# Altium footprint library Footprint.PcbLib: 137 footprints (part 2 of 9)
Each footprint in its own frame and in the unit in brackets; x right, y up, seen from the top. Pads: shape width x height; smd on the part's side, far side on the other; paste and mask are expansions set on the pad; w line width, h text height; cw(c..) or ccw(c..) is an arc to the next point about the centre after c.
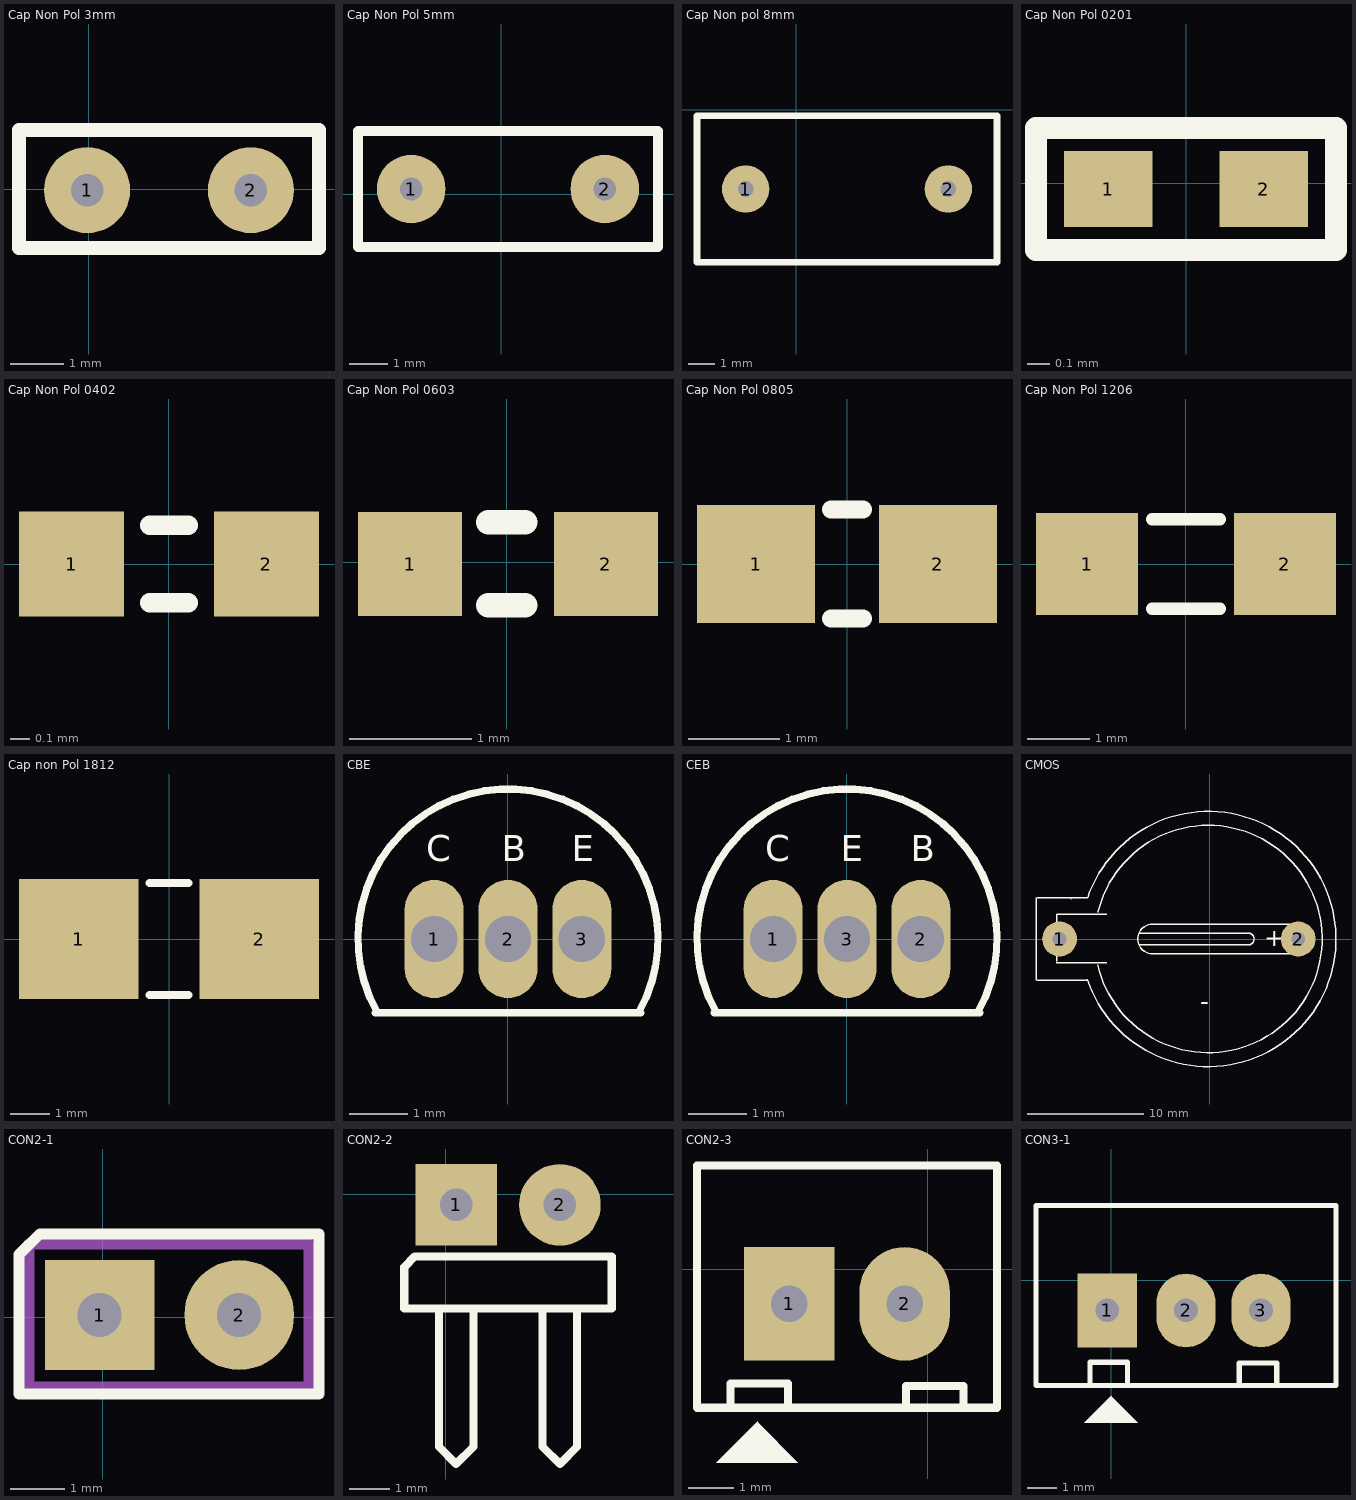
[diagram p1: the footprints below, top view; thin cyan lines are the x and y axes]

## Cap Non Pol 3mm [mm] "d=3mm, pitch=0.1in"
pads (2):
  round 1.6 hole 0.6: 1(-0.026,-0.022) 2(3.022,-0.022)
Top Overlay:
  lines w0.254: -1.296,-1.1 4.292,-1.1 4.292,1.1 -1.296,1.1 -1.296,-1.1
3D body "User Library-Cap 100n.step": height 6.22, standoff -1.7, extent -1.421,-0.855 4.417,0.842

## Cap Non Pol 5mm [mm] "d=5mm, pitch= 0.2in"
pads (2):
  round 1.8 hole 0.6: 1(-2.358,0.132) 2(2.722,0.132)
Top Overlay:
  lines w0.254: -3.755,-1.392 -3.755,1.656 4.119,1.656 4.119,-1.392 -3.755,-1.392
3D body "WIMA RM5 7.2x3x7.5.step": height 7.53, standoff -2.47, extent -3.418,-1.367 3.782,1.633

## Cap Non pol 8mm [mm] "d=8mm,pitch=0.3in"
pads (2):
  round 1.8 hole 0.6: 1(-1.935,-3.016) 2(5.787,-3.016)
Top Overlay:
  lines w0.254: -3.789,-5.81 -3.789,-0.222 7.641,-0.222 7.641,-5.81 -3.789,-5.81
3D body "WIMA RM7.5 10.3x5x12.5.step": height 12.5, standoff -2.5, extent -3.224,-5.518 7.076,-0.518

## Cap Non Pol 0201 [mm] "Cap Non Pol 0201"
pads (2):
  rect 0.4x0.34 smd: 1(-0.35,-0.025) 2(0.35,-0.025)
Top Overlay:
  lines w0.1: -0.675,-0.3 -0.675,0.25 0.675,0.25 0.675,-0.3 -0.675,-0.3
3D body "Cap Non Pol 0201.step": height 0.2, standoff 0, extent -0.3,-0.175 0.3,0.125

## Cap Non Pol 0402 [mm] "Cap Non Pol 0402"
height 0.3
pads (2):
  rect 0.54x0.54 smd: 1(-0.5,0) 2(0.5,0)
Top Overlay:
  lines w0.1: -0.1,-0.2 0.1,-0.2 ; -0.1,0.2 0.1,0.2
3D body "Cap Non Pol 0402.step": height 0.3, standoff 0, extent -0.5,-0.25 0.5,0.25

## Cap Non Pol 0603 [mm] "Cap Non Pol 0603"
pads (2):
  rect 0.85x0.85 smd: 1(-0.79,-0.015) 2(0.81,-0.015)
Top Overlay:
  lines w0.2: -0.15,-0.35 0.15,-0.35 ; -0.15,0.325 0.15,0.325
3D body "Cap Non Pol 0603.step": height 0.4, standoff 0, extent -0.79,-0.415 0.81,0.385

## Cap Non Pol 0805 [mm] "Cap Non Pol 0805"
height 0.6
pads (2):
  rect 1.3x1.3 smd: 1(-1,0) 2(1,0)
Top Overlay:
  lines w0.2: -0.175,-0.6 0.175,-0.6 ; -0.175,0.6 0.175,0.6
3D body "Cap Non Pol 0805.step": height 0.6, standoff 0, extent -1,-0.625 1,0.625

## Cap Non Pol 1206 [mm] "Cap Non Pol 1206"
height 0.8
pads (2):
  rect 1.65x1.65 smd: 1(-1.6,0) 2(1.6,0)
Top Overlay:
  lines w0.2: -0.55,-0.725 0.55,-0.725 ; -0.55,0.725 0.55,0.725
3D body "Cap Non Pol 1206.step": height 0.8, standoff 0, extent -1.6,-0.8 1.6,0.8

## Cap non Pol 1812 [mm] "Cap non Pol 1812"
height 1
pads (2):
  rect 3.05x3.05 smd: 1(-2.3,0) 2(2.3,0)
Top Overlay:
  lines w0.2: -0.5,-1.425 0.5,-1.425 ; -0.5,1.425 0.5,1.425
3D body "Cap non Pol 1812.step": height 1, standoff 0, extent -2.3,-1.5 2.3,1.5

## CBE [mil] "Transistor CBE"
pads (3):
  oval 40x80 hole 31.49 unplated: 1(-49.76,0.24) 2(0.24,0.24) 3(50.24,0.24)
Top Overlay:
  lines w5: -89.76,-49.76 90.24,-49.76 ; -88.71,-48.86 cw(c0.24,0.24) 89.18,-48.86
  text "C" at -55.12,47.24 h30
  text "B" at -3.94,47.24 h30
  text "E" at 43.31,47.24 h30
3D body: height 314.96, standoff 157.48, extent -89.33,-47.99 87.83,89.8
3D body: height 196.85, standoff -39.37, extent 36.65,-10.54 60.23,12.98
3D body: height 196.85, standoff -39.37, extent -12.56,-11.53 11.02,12
3D body: height 196.85, standoff -39.37, extent -63.74,-10.54 -40.16,12.98

## CEB [mil] "Transistor CEB"
pads (3):
  oval 40x80 hole 31.49 unplated: 1(-49.76,0.24) 2(50.24,0.24) 3(0.24,0.24)
Top Overlay:
  lines w5: -89.76,-49.76 90.24,-49.76 ; -88.71,-48.86 cw(c0.24,0.24) 89.18,-48.86
  text "E" at -3.94,47.24 h30
  text "B" at 43.31,47.24 h30
  text "C" at -55.12,47.24 h30
3D body: height 196.85, standoff -39.37, extent -63.74,-10.54 -40.16,12.98
3D body: height 196.85, standoff -39.37, extent -12.56,-11.53 11.02,12
3D body: height 196.85, standoff -39.37, extent 36.65,-10.54 60.23,12.98
3D body: height 314.96, standoff 157.48, extent -89.33,-47.99 87.83,89.8

## CMOS [mm] "Khay pin CMOS"
pads (2):
  round 3 hole 1.2 unplated: 1(-12.954,0) 2(7.62,0)
Top Overlay:
  lines w0.127: -14.986,-3.556 -14.986,3.556 ; -14.871,-3.556 -10.541,-3.556 ; -14.871,3.556 -10.541,3.556 ; -13.224,-2.033 -8.894,-2.033 ; -13.202,-1.905 -13.202,2.124 -8.873,2.124 ; -11.971,3.481 -11.931,3.453 ; -10.563,-3.479 ccw(c-0.127,0) -10.537,3.555 ; -9.674,-2.214 ccw(c-0.127,0) -9.65,2.313 ; -6.096,-0.508 3.302,-0.508 ccw(c3.302,0) 3.302,0.508 -6.096,0.508 ; -4.953,-1.27 cw(c-4.953,0) -4.953,1.27 7.874,1.27 7.874,-1.27 -4.953,-1.27
  text "-" at -0.822,-6.106 h1.54
  text "+" at 4.699,-0.635 h1.54
3D body: height 7, standoff 0.1, extent -15.004,-3.65 -10.304,3.575
3D body: height 1, standoff 0.1, extent -9.904,-10.05 9.821,9.875
3D body: height 7.2, standoff 1, extent -13.454,-2.25 -12.729,2.375
3D body: height 7.2, standoff 1, extent -9.904,-1.807 -9.172,1.85
3D body: height 1.5, standoff 1, extent -12.841,0.794 -9.867,1.844
3D body: height 1.5, standoff 1, extent -12.829,-1.775 -9.854,-0.725
3D body: height 1.5, standoff 1, extent -6.229,-1.3 7.671,1.25
3D body: height 7, standoff 0.2, extent -0.054,-11.05 10.871,10.95
3D body: height 7, standoff 0.2, extent -10.654,2.1 0.021,11
3D body: height 7, standoff 0.1, extent -10.579,-11 -0.054,-2.025

## CON2-1 [mm] "2PIN THANG"
pads (2):
  rect 2x2 hole 0.8: 1(-0.055,0.045)
  round 2 hole 0.8: 2(2.485,0.045)
Top Overlay:
  lines w0.2: -1.524,-1.397 3.937,-1.397 3.937,1.524 -1.143,1.524 -1.524,1.143 -1.524,-1.397
Mechanical 13:
  lines w0.2: -1.344,-1.262 3.756,-1.262 3.756,1.338 -1.344,1.338 -1.344,-1.262
3D body: height 8.89, standoff -2.54, extent 2.231,-0.209 2.739,0.299
3D body: height 8.89, standoff -2.54, extent -0.309,-0.209 0.199,0.299
3D body: height 2.54, standoff 0.25, extent -1.339,-1.232 3.741,1.308

## CON2-2 [mm] "CON2 L"
pads (2):
  rect 2x2 hole 0.8: 1(0.254,-0.254)
  round 2 hole 0.8: 2(2.794,-0.254)
Top Overlay:
  lines w0.2: -0.169,-2.794 -0.169,-6.181 0.254,-6.604 0.677,-6.181 0.677,-2.794 ; 2.371,-2.794 2.371,-6.181 2.794,-6.604 3.217,-6.181 3.217,-2.794 ; -1.016,-2.794 -1.016,-1.778 -0.762,-1.524 4.064,-1.524 4.064,-2.794 -1.016,-2.794
3D body "User Library-0_1inch pin strip right angle (1).step": height 4.35, standoff -2.97, extent -1.016,-7.254 4.064,1.016

## CON2-3 [mm] "CON2 BLOCK"
pads (2):
  rect 2x2.5 hole 0.8: 1(-3.048,-0.762)
  oval 2x2.5 hole 0.8: 2(-0.508,-0.762)
Top Overlay:
  region: -4.661,-4.255 -2.857,-4.255 -3.746,-3.365 -3.746,-3.34
  lines w0.178: -4.343,-3.048 -4.343,-2.515 -3.073,-2.515 -3.073,-3.048 ; -0.483,-3.048 -0.483,-2.565 0.787,-2.565 0.787,-3.048 ; -5.08,-3.048 1.524,-3.048 1.524,2.286 -5.08,2.286 -5.08,-3.048
3D body "User Library-PCB HEADER (JST BxB-PH-K-S (VERTICAL)).STEP": height 6, standoff -1.91, extent -4.778,-2.54 1.222,1.96

## CON3-1 [mm] "CON3 BLOCK"
pads (3):
  rect 2x2.5 hole 0.8: 1(-0.127,-1.016)
  oval 2x2.5 hole 0.8: 2(2.54,-1.016) 3(5.08,-1.016)
Top Overlay:
  region: -0.902,-4.813 0.902,-4.813 0.013,-3.924 0.013,-3.899
  lines w0.178: -0.711,-3.531 -0.711,-2.769 0.559,-2.769 0.559,-3.531 ; 4.343,-3.556 4.343,-2.794 5.613,-2.794 5.613,-3.556 ; -2.54,-3.556 7.62,-3.556 7.62,-1.016 7.62,2.54 -2.54,2.54 -2.54,-3.556
3D body "SW3dPS-jst-b3b-xh-a.STEP": height 7, standoff -3.4, extent -2.41,-3.302 7.49,2.448